# Altium footprint library Connector_Samtec_HLE_SMD.PcbLib: 290 footprints (part 18 of 24) (continued)
## Samtec_HLE-142-02-xxx-DV-LC_2x42_P2.54mm_Horizontal [mm]
pads (86):
  rect 1.27x2.29 smd: 1(-52.07,2.525) 2(-52.07,-2.525) 3(-49.53,2.525) 4(-49.53,-2.525) 5(-46.99,2.525) 6(-46.99,-2.525) 7(-44.45,2.525) 8(-44.45,-2.525) 9(-41.91,2.525) 10(-41.91,-2.525) 11(-39.37,2.525) 12(-39.37,-2.525) 13(-36.83,2.525) 14(-36.83,-2.525) 15(-34.29,2.525) 16(-34.29,-2.525) 17(-31.75,2.525) 18(-31.75,-2.525) 19(-29.21,2.525) 20(-29.21,-2.525) 21(-26.67,2.525) 22(-26.67,-2.525) 23(-24.13,2.525) 24(-24.13,-2.525) 25(-21.59,2.525) 26(-21.59,-2.525) 27(-19.05,2.525) 28(-19.05,-2.525) 29(-16.51,2.525) 30(-16.51,-2.525) 31(-13.97,2.525) 32(-13.97,-2.525) 33(-11.43,2.525) 34(-11.43,-2.525) 35(-8.89,2.525) 36(-8.89,-2.525) 37(-6.35,2.525) 38(-6.35,-2.525) 39(-3.81,2.525) 40(-3.81,-2.525) 41(-1.27,2.525) 42(-1.27,-2.525) 43(1.27,2.525) 44(1.27,-2.525) 45(3.81,2.525) 46(3.81,-2.525) 47(6.35,2.525) 48(6.35,-2.525) 49(8.89,2.525) 50(8.89,-2.525) 51(11.43,2.525) 52(11.43,-2.525) 53(13.97,2.525) 54(13.97,-2.525) 55(16.51,2.525) 56(16.51,-2.525) 57(19.05,2.525) 58(19.05,-2.525) 59(21.59,2.525) 60(21.59,-2.525) 61(24.13,2.525) 62(24.13,-2.525) 63(26.67,2.525) 64(26.67,-2.525) 65(29.21,2.525) 66(29.21,-2.525) 67(31.75,2.525) 68(31.75,-2.525) 69(34.29,2.525) 70(34.29,-2.525) 71(36.83,2.525) 72(36.83,-2.525) 73(39.37,2.525) 74(39.37,-2.525) 75(41.91,2.525) 76(41.91,-2.525) 77(44.45,2.525) 78(44.45,-2.525) 79(46.99,2.525) 80(46.99,-2.525) 81(49.53,2.525) 82(49.53,-2.525) 83(52.07,2.525) 84(52.07,-2.525)
  round 1.19 hole 1.19: Un1(-50.8,0) Un2(50.8,0)
F.SilkS:
  lines w0.12: -52.965,-2.65 -53.45,-2.65 -53.45,2.65 -52.965,2.65 -52.965,3.67 ; -51.175,-2.65 -50.425,-2.65 ; -51.175,2.65 -50.425,2.65 ; -48.635,-2.65 -47.885,-2.65 ; -48.635,2.65 -47.885,2.65 ; -46.095,-2.65 -45.345,-2.65 ; -46.095,2.65 -45.345,2.65 ; -43.555,-2.65 -42.805,-2.65 ; -43.555,2.65 -42.805,2.65 ; -41.015,-2.65 -40.265,-2.65 ; -41.015,2.65 -40.265,2.65 ; -38.475,-2.65 -37.725,-2.65 ; -38.475,2.65 -37.725,2.65 ; -35.935,-2.65 -35.185,-2.65 ; -35.935,2.65 -35.185,2.65 ; -33.395,-2.65 -32.645,-2.65 ; -33.395,2.65 -32.645,2.65 ; -30.855,-2.65 -30.105,-2.65 ; -30.855,2.65 -30.105,2.65 ; -28.315,-2.65 -27.565,-2.65 ; -28.315,2.65 -27.565,2.65 ; -25.775,-2.65 -25.025,-2.65 ; -25.775,2.65 -25.025,2.65 ; -23.235,-2.65 -22.485,-2.65 ; -23.235,2.65 -22.485,2.65 ; -20.695,-2.65 -19.945,-2.65 ; -20.695,2.65 -19.945,2.65 ; -18.155,-2.65 -17.405,-2.65 ; -18.155,2.65 -17.405,2.65 ; -15.615,-2.65 -14.865,-2.65 ; -15.615,2.65 -14.865,2.65 ; -13.075,-2.65 -12.325,-2.65 ; -13.075,2.65 -12.325,2.65 ; -10.535,-2.65 -9.785,-2.65 ; -10.535,2.65 -9.785,2.65 ; -7.995,-2.65 -7.245,-2.65 ; -7.995,2.65 -7.245,2.65 ; -5.455,-2.65 -4.705,-2.65 ; -5.455,2.65 -4.705,2.65 ; -2.915,-2.65 -2.165,-2.65 ; -2.915,2.65 -2.165,2.65 ; -0.375,-2.65 0.375,-2.65 ; -0.375,2.65 0.375,2.65 ; 2.165,-2.65 2.915,-2.65 ; 2.165,2.65 2.915,2.65 ; 4.705,-2.65 5.455,-2.65 ; 4.705,2.65 5.455,2.65 ; 7.245,-2.65 7.995,-2.65 ; 7.245,2.65 7.995,2.65 ; 9.785,-2.65 10.535,-2.65 ; 9.785,2.65 10.535,2.65 ; 12.325,-2.65 13.075,-2.65 ; 12.325,2.65 13.075,2.65 ; 14.865,-2.65 15.615,-2.65 ; 14.865,2.65 15.615,2.65 ; 17.405,-2.65 18.155,-2.65 ; 17.405,2.65 18.155,2.65 ; 19.945,-2.65 20.695,-2.65 ; 19.945,2.65 20.695,2.65 ; 22.485,-2.65 23.235,-2.65 ; 22.485,2.65 23.235,2.65 ; 25.025,-2.65 25.775,-2.65 ; 25.025,2.65 25.775,2.65 ; 27.565,-2.65 28.315,-2.65 ; 27.565,2.65 28.315,2.65 ; 30.105,-2.65 30.855,-2.65 ; 30.105,2.65 30.855,2.65 ; 32.645,-2.65 33.395,-2.65 ; 32.645,2.65 33.395,2.65 ; 35.185,-2.65 35.935,-2.65 ; 35.185,2.65 35.935,2.65 ; 37.725,-2.65 38.475,-2.65 ; 37.725,2.65 38.475,2.65 ; 40.265,-2.65 41.015,-2.65 ; 40.265,2.65 41.015,2.65 ; 42.805,-2.65 43.555,-2.65 ; 42.805,2.65 43.555,2.65 ; 45.345,-2.65 46.095,-2.65 ; 45.345,2.65 46.095,2.65 ; 47.885,-2.65 48.635,-2.65 ; 47.885,2.65 48.635,2.65 ; 50.425,-2.65 51.175,-2.65 ; 50.425,2.65 51.175,2.65 ; 52.965,-2.65 53.45,-2.65 53.45,2.65 52.965,2.65
F.CrtYd:
  lines w0.05: -53.84,-4.17 -53.84,4.17 53.84,4.17 53.84,-4.17 -53.84,-4.17
F.Fab:
  lines w0.1: -52.57,2.54 -52.07,1.833 -51.57,2.54 ; -53.34,-2.54 -53.34,2.54 53.34,2.54 53.34,-2.54 -53.34,-2.54
  text "'.Designator'" at -4.047,-2.68 h1

## Samtec_HLE-142-02-xxx-DV_2x42_P2.54mm_Horizontal [mm]
pads (84):
  rect 1.27x2.29 smd: 1(-52.07,2.525) 2(-52.07,-2.525) 3(-49.53,2.525) 4(-49.53,-2.525) 5(-46.99,2.525) 6(-46.99,-2.525) 7(-44.45,2.525) 8(-44.45,-2.525) 9(-41.91,2.525) 10(-41.91,-2.525) 11(-39.37,2.525) 12(-39.37,-2.525) 13(-36.83,2.525) 14(-36.83,-2.525) 15(-34.29,2.525) 16(-34.29,-2.525) 17(-31.75,2.525) 18(-31.75,-2.525) 19(-29.21,2.525) 20(-29.21,-2.525) 21(-26.67,2.525) 22(-26.67,-2.525) 23(-24.13,2.525) 24(-24.13,-2.525) 25(-21.59,2.525) 26(-21.59,-2.525) 27(-19.05,2.525) 28(-19.05,-2.525) 29(-16.51,2.525) 30(-16.51,-2.525) 31(-13.97,2.525) 32(-13.97,-2.525) 33(-11.43,2.525) 34(-11.43,-2.525) 35(-8.89,2.525) 36(-8.89,-2.525) 37(-6.35,2.525) 38(-6.35,-2.525) 39(-3.81,2.525) 40(-3.81,-2.525) 41(-1.27,2.525) 42(-1.27,-2.525) 43(1.27,2.525) 44(1.27,-2.525) 45(3.81,2.525) 46(3.81,-2.525) 47(6.35,2.525) 48(6.35,-2.525) 49(8.89,2.525) 50(8.89,-2.525) 51(11.43,2.525) 52(11.43,-2.525) 53(13.97,2.525) 54(13.97,-2.525) 55(16.51,2.525) 56(16.51,-2.525) 57(19.05,2.525) 58(19.05,-2.525) 59(21.59,2.525) 60(21.59,-2.525) 61(24.13,2.525) 62(24.13,-2.525) 63(26.67,2.525) 64(26.67,-2.525) 65(29.21,2.525) 66(29.21,-2.525) 67(31.75,2.525) 68(31.75,-2.525) 69(34.29,2.525) 70(34.29,-2.525) 71(36.83,2.525) 72(36.83,-2.525) 73(39.37,2.525) 74(39.37,-2.525) 75(41.91,2.525) 76(41.91,-2.525) 77(44.45,2.525) 78(44.45,-2.525) 79(46.99,2.525) 80(46.99,-2.525) 81(49.53,2.525) 82(49.53,-2.525) 83(52.07,2.525) 84(52.07,-2.525)
F.SilkS:
  lines w0.12: -52.965,-2.65 -53.45,-2.65 -53.45,2.65 -52.965,2.65 -52.965,3.67 ; -51.175,-2.65 -50.425,-2.65 ; -51.175,2.65 -50.425,2.65 ; -48.635,-2.65 -47.885,-2.65 ; -48.635,2.65 -47.885,2.65 ; -46.095,-2.65 -45.345,-2.65 ; -46.095,2.65 -45.345,2.65 ; -43.555,-2.65 -42.805,-2.65 ; -43.555,2.65 -42.805,2.65 ; -41.015,-2.65 -40.265,-2.65 ; -41.015,2.65 -40.265,2.65 ; -38.475,-2.65 -37.725,-2.65 ; -38.475,2.65 -37.725,2.65 ; -35.935,-2.65 -35.185,-2.65 ; -35.935,2.65 -35.185,2.65 ; -33.395,-2.65 -32.645,-2.65 ; -33.395,2.65 -32.645,2.65 ; -30.855,-2.65 -30.105,-2.65 ; -30.855,2.65 -30.105,2.65 ; -28.315,-2.65 -27.565,-2.65 ; -28.315,2.65 -27.565,2.65 ; -25.775,-2.65 -25.025,-2.65 ; -25.775,2.65 -25.025,2.65 ; -23.235,-2.65 -22.485,-2.65 ; -23.235,2.65 -22.485,2.65 ; -20.695,-2.65 -19.945,-2.65 ; -20.695,2.65 -19.945,2.65 ; -18.155,-2.65 -17.405,-2.65 ; -18.155,2.65 -17.405,2.65 ; -15.615,-2.65 -14.865,-2.65 ; -15.615,2.65 -14.865,2.65 ; -13.075,-2.65 -12.325,-2.65 ; -13.075,2.65 -12.325,2.65 ; -10.535,-2.65 -9.785,-2.65 ; -10.535,2.65 -9.785,2.65 ; -7.995,-2.65 -7.245,-2.65 ; -7.995,2.65 -7.245,2.65 ; -5.455,-2.65 -4.705,-2.65 ; -5.455,2.65 -4.705,2.65 ; -2.915,-2.65 -2.165,-2.65 ; -2.915,2.65 -2.165,2.65 ; -0.375,-2.65 0.375,-2.65 ; -0.375,2.65 0.375,2.65 ; 2.165,-2.65 2.915,-2.65 ; 2.165,2.65 2.915,2.65 ; 4.705,-2.65 5.455,-2.65 ; 4.705,2.65 5.455,2.65 ; 7.245,-2.65 7.995,-2.65 ; 7.245,2.65 7.995,2.65 ; 9.785,-2.65 10.535,-2.65 ; 9.785,2.65 10.535,2.65 ; 12.325,-2.65 13.075,-2.65 ; 12.325,2.65 13.075,2.65 ; 14.865,-2.65 15.615,-2.65 ; 14.865,2.65 15.615,2.65 ; 17.405,-2.65 18.155,-2.65 ; 17.405,2.65 18.155,2.65 ; 19.945,-2.65 20.695,-2.65 ; 19.945,2.65 20.695,2.65 ; 22.485,-2.65 23.235,-2.65 ; 22.485,2.65 23.235,2.65 ; 25.025,-2.65 25.775,-2.65 ; 25.025,2.65 25.775,2.65 ; 27.565,-2.65 28.315,-2.65 ; 27.565,2.65 28.315,2.65 ; 30.105,-2.65 30.855,-2.65 ; 30.105,2.65 30.855,2.65 ; 32.645,-2.65 33.395,-2.65 ; 32.645,2.65 33.395,2.65 ; 35.185,-2.65 35.935,-2.65 ; 35.185,2.65 35.935,2.65 ; 37.725,-2.65 38.475,-2.65 ; 37.725,2.65 38.475,2.65 ; 40.265,-2.65 41.015,-2.65 ; 40.265,2.65 41.015,2.65 ; 42.805,-2.65 43.555,-2.65 ; 42.805,2.65 43.555,2.65 ; 45.345,-2.65 46.095,-2.65 ; 45.345,2.65 46.095,2.65 ; 47.885,-2.65 48.635,-2.65 ; 47.885,2.65 48.635,2.65 ; 50.425,-2.65 51.175,-2.65 ; 50.425,2.65 51.175,2.65 ; 52.965,-2.65 53.45,-2.65 53.45,2.65 52.965,2.65
F.CrtYd:
  lines w0.05: -53.84,-4.17 -53.84,4.17 53.84,4.17 53.84,-4.17 -53.84,-4.17
F.Fab:
  lines w0.1: -52.57,2.54 -52.07,1.833 -51.57,2.54 ; -53.34,-2.54 53.34,-2.54 53.34,2.54 -53.34,2.54 -53.34,-2.54
  text "'.Designator'" at -4.047,-2.68 h1

## Samtec_HLE-143-02-xxx-DV-A_2x43_P2.54mm_Horizontal [mm]
pads (88):
  rect 1.27x2.29 smd: 1(-53.34,2.525) 2(-53.34,-2.525) 3(-50.8,2.525) 4(-50.8,-2.525) 5(-48.26,2.525) 6(-48.26,-2.525) 7(-45.72,2.525) 8(-45.72,-2.525) 9(-43.18,2.525) 10(-43.18,-2.525) 11(-40.64,2.525) 12(-40.64,-2.525) 13(-38.1,2.525) 14(-38.1,-2.525) 15(-35.56,2.525) 16(-35.56,-2.525) 17(-33.02,2.525) 18(-33.02,-2.525) 19(-30.48,2.525) 20(-30.48,-2.525) 21(-27.94,2.525) 22(-27.94,-2.525) 23(-25.4,2.525) 24(-25.4,-2.525) 25(-22.86,2.525) 26(-22.86,-2.525) 27(-20.32,2.525) 28(-20.32,-2.525) 29(-17.78,2.525) 30(-17.78,-2.525) 31(-15.24,2.525) 32(-15.24,-2.525) 33(-12.7,2.525) 34(-12.7,-2.525) 35(-10.16,2.525) 36(-10.16,-2.525) 37(-7.62,2.525) 38(-7.62,-2.525) 39(-5.08,2.525) 40(-5.08,-2.525) 41(-2.54,2.525) 42(-2.54,-2.525) 43(0,2.525) 44(0,-2.525) 45(2.54,2.525) 46(2.54,-2.525) 47(5.08,2.525) 48(5.08,-2.525) 49(7.62,2.525) 50(7.62,-2.525) 51(10.16,2.525) 52(10.16,-2.525) 53(12.7,2.525) 54(12.7,-2.525) 55(15.24,2.525) 56(15.24,-2.525) 57(17.78,2.525) 58(17.78,-2.525) 59(20.32,2.525) 60(20.32,-2.525) 61(22.86,2.525) 62(22.86,-2.525) 63(25.4,2.525) 64(25.4,-2.525) 65(27.94,2.525) 66(27.94,-2.525) 67(30.48,2.525) 68(30.48,-2.525) 69(33.02,2.525) 70(33.02,-2.525) 71(35.56,2.525) 72(35.56,-2.525) 73(38.1,2.525) 74(38.1,-2.525) 75(40.64,2.525) 76(40.64,-2.525) 77(43.18,2.525) 78(43.18,-2.525) 79(45.72,2.525) 80(45.72,-2.525) 81(48.26,2.525) 82(48.26,-2.525) 83(50.8,2.525) 84(50.8,-2.525) 85(53.34,2.525) 86(53.34,-2.525)
  round 1.78 hole 1.78: Un1(-52.07,0) Un2(52.07,0)
F.SilkS:
  lines w0.12: -54.235,-2.65 -54.72,-2.65 -54.72,2.65 -54.235,2.65 -54.235,3.67 ; -52.445,-2.65 -51.695,-2.65 ; -52.445,2.65 -51.695,2.65 ; -49.905,-2.65 -49.155,-2.65 ; -49.905,2.65 -49.155,2.65 ; -47.365,-2.65 -46.615,-2.65 ; -47.365,2.65 -46.615,2.65 ; -44.825,-2.65 -44.075,-2.65 ; -44.825,2.65 -44.075,2.65 ; -42.285,-2.65 -41.535,-2.65 ; -42.285,2.65 -41.535,2.65 ; -39.745,-2.65 -38.995,-2.65 ; -39.745,2.65 -38.995,2.65 ; -37.205,-2.65 -36.455,-2.65 ; -37.205,2.65 -36.455,2.65 ; -34.665,-2.65 -33.915,-2.65 ; -34.665,2.65 -33.915,2.65 ; -32.125,-2.65 -31.375,-2.65 ; -32.125,2.65 -31.375,2.65 ; -29.585,-2.65 -28.835,-2.65 ; -29.585,2.65 -28.835,2.65 ; -27.045,-2.65 -26.295,-2.65 ; -27.045,2.65 -26.295,2.65 ; -24.505,-2.65 -23.755,-2.65 ; -24.505,2.65 -23.755,2.65 ; -21.965,-2.65 -21.215,-2.65 ; -21.965,2.65 -21.215,2.65 ; -19.425,-2.65 -18.675,-2.65 ; -19.425,2.65 -18.675,2.65 ; -16.885,-2.65 -16.135,-2.65 ; -16.885,2.65 -16.135,2.65 ; -14.345,-2.65 -13.595,-2.65 ; -14.345,2.65 -13.595,2.65 ; -11.805,-2.65 -11.055,-2.65 ; -11.805,2.65 -11.055,2.65 ; -9.265,-2.65 -8.515,-2.65 ; -9.265,2.65 -8.515,2.65 ; -6.725,-2.65 -5.975,-2.65 ; -6.725,2.65 -5.975,2.65 ; -4.185,-2.65 -3.435,-2.65 ; -4.185,2.65 -3.435,2.65 ; -1.645,-2.65 -0.895,-2.65 ; -1.645,2.65 -0.895,2.65 ; 0.895,-2.65 1.645,-2.65 ; 0.895,2.65 1.645,2.65 ; 3.435,-2.65 4.185,-2.65 ; 3.435,2.65 4.185,2.65 ; 5.975,-2.65 6.725,-2.65 ; 5.975,2.65 6.725,2.65 ; 8.515,-2.65 9.265,-2.65 ; 8.515,2.65 9.265,2.65 ; 11.055,-2.65 11.805,-2.65 ; 11.055,2.65 11.805,2.65 ; 13.595,-2.65 14.345,-2.65 ; 13.595,2.65 14.345,2.65 ; 16.135,-2.65 16.885,-2.65 ; 16.135,2.65 16.885,2.65 ; 18.675,-2.65 19.425,-2.65 ; 18.675,2.65 19.425,2.65 ; 21.215,-2.65 21.965,-2.65 ; 21.215,2.65 21.965,2.65 ; 23.755,-2.65 24.505,-2.65 ; 23.755,2.65 24.505,2.65 ; 26.295,-2.65 27.045,-2.65 ; 26.295,2.65 27.045,2.65 ; 28.835,-2.65 29.585,-2.65 ; 28.835,2.65 29.585,2.65 ; 31.375,-2.65 32.125,-2.65 ; 31.375,2.65 32.125,2.65 ; 33.915,-2.65 34.665,-2.65 ; 33.915,2.65 34.665,2.65 ; 36.455,-2.65 37.205,-2.65 ; 36.455,2.65 37.205,2.65 ; 38.995,-2.65 39.745,-2.65 ; 38.995,2.65 39.745,2.65 ; 41.535,-2.65 42.285,-2.65 ; 41.535,2.65 42.285,2.65 ; 44.075,-2.65 44.825,-2.65 ; 44.075,2.65 44.825,2.65 ; 46.615,-2.65 47.365,-2.65 ; 46.615,2.65 47.365,2.65 ; 49.155,-2.65 49.905,-2.65 ; 49.155,2.65 49.905,2.65 ; 51.695,-2.65 52.445,-2.65 ; 51.695,2.65 52.445,2.65 ; 54.235,-2.65 54.72,-2.65 54.72,2.65 54.235,2.65
F.CrtYd:
  lines w0.05: -55.11,-4.17 -55.11,4.17 55.11,4.17 55.11,-4.17 -55.11,-4.17
F.Fab:
  lines w0.1: -53.84,2.54 -53.34,1.833 -52.84,2.54 ; -54.61,-2.54 -54.61,2.54 54.61,2.54 54.61,-2.54 -54.61,-2.54
  text "'.Designator'" at -4.047,-2.68 h1

## Samtec_HLE-143-02-xxx-DV-BE-A_2x43_P2.54mm_Horizontal [mm]
pads (174):
  rect 1.27x1.68 smd: 1(-53.34,2.72) 2(-53.34,-2.72) 3(-50.8,2.72) 4(-50.8,-2.72) 5(-48.26,2.72) 6(-48.26,-2.72) 7(-45.72,2.72) 8(-45.72,-2.72) 9(-43.18,2.72) 10(-43.18,-2.72) 11(-40.64,2.72) 12(-40.64,-2.72) 13(-38.1,2.72) 14(-38.1,-2.72) 15(-35.56,2.72) 16(-35.56,-2.72) 17(-33.02,2.72) 18(-33.02,-2.72) 19(-30.48,2.72) 20(-30.48,-2.72) 21(-27.94,2.72) 22(-27.94,-2.72) 23(-25.4,2.72) 24(-25.4,-2.72) 25(-22.86,2.72) 26(-22.86,-2.72) 27(-20.32,2.72) 28(-20.32,-2.72) 29(-17.78,2.72) 30(-17.78,-2.72) 31(-15.24,2.72) 32(-15.24,-2.72) 33(-12.7,2.72) 34(-12.7,-2.72) 35(-10.16,2.72) 36(-10.16,-2.72) 37(-7.62,2.72) 38(-7.62,-2.72) 39(-5.08,2.72) 40(-5.08,-2.72) 41(-2.54,2.72) 42(-2.54,-2.72) 43(0,2.72) 44(0,-2.72) 45(2.54,2.72) 46(2.54,-2.72) 47(5.08,2.72) 48(5.08,-2.72) 49(7.62,2.72) 50(7.62,-2.72) 51(10.16,2.72) 52(10.16,-2.72) 53(12.7,2.72) 54(12.7,-2.72) 55(15.24,2.72) 56(15.24,-2.72) 57(17.78,2.72) 58(17.78,-2.72) 59(20.32,2.72) 60(20.32,-2.72) 61(22.86,2.72) 62(22.86,-2.72) 63(25.4,2.72) 64(25.4,-2.72) 65(27.94,2.72) 66(27.94,-2.72) 67(30.48,2.72) 68(30.48,-2.72) 69(33.02,2.72) 70(33.02,-2.72) 71(35.56,2.72) 72(35.56,-2.72) 73(38.1,2.72) 74(38.1,-2.72) 75(40.64,2.72) 76(40.64,-2.72) 77(43.18,2.72) 78(43.18,-2.72) 79(45.72,2.72) 80(45.72,-2.72) 81(48.26,2.72) 82(48.26,-2.72) 83(50.8,2.72) 84(50.8,-2.72) 85(53.34,2.72) 86(53.34,-2.72)
  round 0.97 hole 0.97: Un1(33.02,-1.27) Un2(53.34,1.27) Un3(35.56,-1.27) Un4(-40.64,1.27) Un5(-50.8,-1.27) Un6(-12.7,-1.27) Un7(48.26,-1.27) Un8(12.7,1.27) Un9(15.24,-1.27) Un10(-20.32,-1.27) Un11(-17.78,-1.27) Un12(-48.26,1.27) Un13(-33.02,-1.27) Un14(43.18,1.27) Un15(43.18,-1.27) Un16(35.56,1.27) Un17(-53.34,1.27) Un18(-30.48,-1.27) Un19(7.62,-1.27) Un20(33.02,1.27) Un21(-15.24,1.27) Un22(-53.34,-1.27) Un23(48.26,1.27) Un24(-38.1,-1.27) Un25(-22.86,1.27) Un26(50.8,1.27) Un27(-27.94,1.27) Un28(-5.08,-1.27) Un29(25.4,1.27) Un30(-35.56,1.27) Un31(40.64,-1.27) Un32(38.1,1.27) Un33(10.16,1.27) Un34(-25.4,-1.27) Un35(-22.86,-1.27) Un36(-45.72,1.27) Un37(38.1,-1.27) Un38(-15.24,-1.27) Un39(-40.64,-1.27) Un40(-10.16,-1.27) Un41(50.8,-1.27) Un42(45.72,-1.27) Un43(2.54,1.27) Un44(-12.7,1.27) Un45(-25.4,1.27) Un46(-30.48,1.27) Un47(-38.1,1.27) Un48(30.48,1.27) Un49(5.08,-1.27) Un50(-7.62,-1.27) Un51(0,1.27) Un52(12.7,-1.27) Un53(30.48,-1.27) Un54(15.24,1.27) Un56(27.94,1.27) Un57(-17.78,1.27) Un58(7.62,1.27) Un59(2.54,-1.27) Un60(10.16,-1.27) Un61(-5.08,1.27) Un62(20.32,1.27) Un63(22.86,1.27) Un64(-2.54,1.27) Un65(45.72,1.27) Un66(-48.26,-1.27) Un67(20.32,-1.27) Un68(-45.72,-1.27) Un69(53.34,-1.27) Un70(17.78,1.27) Un71(27.94,-1.27) Un72(40.64,1.27) Un73(-33.02,1.27) Un74(0,-1.27) Un75(-35.56,-1.27) Un76(-50.8,1.27) Un77(-43.18,-1.27) Un78(17.78,-1.27) Un79(-2.54,-1.27) Un80(-27.94,-1.27) Un81(25.4,-1.27) Un82(-10.16,1.27) Un83(-43.18,1.27) Un84(-7.62,1.27) Un85(-20.32,1.27) Un87(22.86,-1.27) Un88(5.08,1.27)
  round 1.78 hole 1.78: Un55(52.07,0) Un86(-52.07,0)
F.SilkS:
  lines w0.12: -54.235,-2.65 -54.72,-2.65 -54.72,2.65 -54.235,2.65 -54.235,3.56 ; -52.445,-2.65 -51.695,-2.65 ; -52.445,2.65 -51.695,2.65 ; -49.905,-2.65 -49.155,-2.65 ; -49.905,2.65 -49.155,2.65 ; -47.365,-2.65 -46.615,-2.65 ; -47.365,2.65 -46.615,2.65 ; -44.825,-2.65 -44.075,-2.65 ; -44.825,2.65 -44.075,2.65 ; -42.285,-2.65 -41.535,-2.65 ; -42.285,2.65 -41.535,2.65 ; -39.745,-2.65 -38.995,-2.65 ; -39.745,2.65 -38.995,2.65 ; -37.205,-2.65 -36.455,-2.65 ; -37.205,2.65 -36.455,2.65 ; -34.665,-2.65 -33.915,-2.65 ; -34.665,2.65 -33.915,2.65 ; -32.125,-2.65 -31.375,-2.65 ; -32.125,2.65 -31.375,2.65 ; -29.585,-2.65 -28.835,-2.65 ; -29.585,2.65 -28.835,2.65 ; -27.045,-2.65 -26.295,-2.65 ; -27.045,2.65 -26.295,2.65 ; -24.505,-2.65 -23.755,-2.65 ; -24.505,2.65 -23.755,2.65 ; -21.965,-2.65 -21.215,-2.65 ; -21.965,2.65 -21.215,2.65 ; -19.425,-2.65 -18.675,-2.65 ; -19.425,2.65 -18.675,2.65 ; -16.885,-2.65 -16.135,-2.65 ; -16.885,2.65 -16.135,2.65 ; -14.345,-2.65 -13.595,-2.65 ; -14.345,2.65 -13.595,2.65 ; -11.805,-2.65 -11.055,-2.65 ; -11.805,2.65 -11.055,2.65 ; -9.265,-2.65 -8.515,-2.65 ; -9.265,2.65 -8.515,2.65 ; -6.725,-2.65 -5.975,-2.65 ; -6.725,2.65 -5.975,2.65 ; -4.185,-2.65 -3.435,-2.65 ; -4.185,2.65 -3.435,2.65 ; -1.645,-2.65 -0.895,-2.65 ; -1.645,2.65 -0.895,2.65 ; 0.895,-2.65 1.645,-2.65 ; 0.895,2.65 1.645,2.65 ; 3.435,-2.65 4.185,-2.65 ; 3.435,2.65 4.185,2.65 ; 5.975,-2.65 6.725,-2.65 ; 5.975,2.65 6.725,2.65 ; 8.515,-2.65 9.265,-2.65 ; 8.515,2.65 9.265,2.65 ; 11.055,-2.65 11.805,-2.65 ; 11.055,2.65 11.805,2.65 ; 13.595,-2.65 14.345,-2.65 ; 13.595,2.65 14.345,2.65 ; 16.135,-2.65 16.885,-2.65 ; 16.135,2.65 16.885,2.65 ; 18.675,-2.65 19.425,-2.65 ; 18.675,2.65 19.425,2.65 ; 21.215,-2.65 21.965,-2.65 ; 21.215,2.65 21.965,2.65 ; 23.755,-2.65 24.505,-2.65 ; 23.755,2.65 24.505,2.65 ; 26.295,-2.65 27.045,-2.65 ; 26.295,2.65 27.045,2.65 ; 28.835,-2.65 29.585,-2.65 ; 28.835,2.65 29.585,2.65 ; 31.375,-2.65 32.125,-2.65 ; 31.375,2.65 32.125,2.65 ; 33.915,-2.65 34.665,-2.65 ; 33.915,2.65 34.665,2.65 ; 36.455,-2.65 37.205,-2.65 ; 36.455,2.65 37.205,2.65 ; 38.995,-2.65 39.745,-2.65 ; 38.995,2.65 39.745,2.65 ; 41.535,-2.65 42.285,-2.65 ; 41.535,2.65 42.285,2.65 ; 44.075,-2.65 44.825,-2.65 ; 44.075,2.65 44.825,2.65 ; 46.615,-2.65 47.365,-2.65 ; 46.615,2.65 47.365,2.65 ; 49.155,-2.65 49.905,-2.65 ; 49.155,2.65 49.905,2.65 ; 51.695,-2.65 52.445,-2.65 ; 51.695,2.65 52.445,2.65 ; 54.235,-2.65 54.72,-2.65 54.72,2.65 54.235,2.65
F.CrtYd:
  lines w0.05: -55.11,-4.06 -55.11,4.06 55.11,4.06 55.11,-4.06 -55.11,-4.06
F.Fab:
  lines w0.1: -53.84,2.54 -53.34,1.833 -52.84,2.54 ; -54.61,-2.54 54.61,-2.54 54.61,2.54 -54.61,2.54 -54.61,-2.54
  text "'.Designator'" at -4.047,-2.68 h1

## Samtec_HLE-143-02-xxx-DV-BE-LC_2x43_P2.54mm_Horizontal [mm]
pads (174):
  rect 1.27x1.68 smd: 1(-53.34,2.72) 2(-53.34,-2.72) 3(-50.8,2.72) 4(-50.8,-2.72) 5(-48.26,2.72) 6(-48.26,-2.72) 7(-45.72,2.72) 8(-45.72,-2.72) 9(-43.18,2.72) 10(-43.18,-2.72) 11(-40.64,2.72) 12(-40.64,-2.72) 13(-38.1,2.72) 14(-38.1,-2.72) 15(-35.56,2.72) 16(-35.56,-2.72) 17(-33.02,2.72) 18(-33.02,-2.72) 19(-30.48,2.72) 20(-30.48,-2.72) 21(-27.94,2.72) 22(-27.94,-2.72) 23(-25.4,2.72) 24(-25.4,-2.72) 25(-22.86,2.72) 26(-22.86,-2.72) 27(-20.32,2.72) 28(-20.32,-2.72) 29(-17.78,2.72) 30(-17.78,-2.72) 31(-15.24,2.72) 32(-15.24,-2.72) 33(-12.7,2.72) 34(-12.7,-2.72) 35(-10.16,2.72) 36(-10.16,-2.72) 37(-7.62,2.72) 38(-7.62,-2.72) 39(-5.08,2.72) 40(-5.08,-2.72) 41(-2.54,2.72) 42(-2.54,-2.72) 43(0,2.72) 44(0,-2.72) 45(2.54,2.72) 46(2.54,-2.72) 47(5.08,2.72) 48(5.08,-2.72) 49(7.62,2.72) 50(7.62,-2.72) 51(10.16,2.72) 52(10.16,-2.72) 53(12.7,2.72) 54(12.7,-2.72) 55(15.24,2.72) 56(15.24,-2.72) 57(17.78,2.72) 58(17.78,-2.72) 59(20.32,2.72) 60(20.32,-2.72) 61(22.86,2.72) 62(22.86,-2.72) 63(25.4,2.72) 64(25.4,-2.72) 65(27.94,2.72) 66(27.94,-2.72) 67(30.48,2.72) 68(30.48,-2.72) 69(33.02,2.72) 70(33.02,-2.72) 71(35.56,2.72) 72(35.56,-2.72) 73(38.1,2.72) 74(38.1,-2.72) 75(40.64,2.72) 76(40.64,-2.72) 77(43.18,2.72) 78(43.18,-2.72) 79(45.72,2.72) 80(45.72,-2.72) 81(48.26,2.72) 82(48.26,-2.72) 83(50.8,2.72) 84(50.8,-2.72) 85(53.34,2.72) 86(53.34,-2.72)
  round 0.97 hole 0.97: Un1(53.34,-1.27) Un2(30.48,1.27) Un3(7.62,-1.27) Un4(43.18,-1.27) Un5(-43.18,-1.27) Un6(-20.32,-1.27) Un7(-17.78,-1.27) Un8(-27.94,-1.27) Un9(-22.86,-1.27) Un10(-20.32,1.27) Un11(27.94,-1.27) Un12(-25.4,-1.27) Un13(0,1.27) Un14(-48.26,1.27) Un15(-12.7,1.27) Un16(40.64,-1.27) Un17(-50.8,1.27) Un19(15.24,-1.27) Un20(17.78,-1.27) Un21(35.56,-1.27) Un22(22.86,-1.27) Un23(-15.24,-1.27) Un24(25.4,1.27) Un25(12.7,1.27) Un26(-40.64,1.27) Un27(-12.7,-1.27) Un28(35.56,1.27) Un29(-22.86,1.27) Un30(-38.1,1.27) Un31(-30.48,1.27) Un32(-43.18,1.27) Un33(-10.16,-1.27) Un34(-48.26,-1.27) Un35(2.54,1.27) Un36(-50.8,-1.27) Un37(-5.08,-1.27) Un38(-2.54,-1.27) Un39(43.18,1.27) Un40(-40.64,-1.27) Un41(15.24,1.27) Un42(-7.62,1.27) Un43(25.4,-1.27) Un44(-33.02,1.27) Un45(45.72,-1.27) Un46(10.16,1.27) Un47(-53.34,-1.27) Un48(12.7,-1.27) Un49(20.32,-1.27) Un50(0,-1.27) Un51(50.8,1.27) Un52(48.26,1.27) Un53(-33.02,-1.27) Un54(-30.48,-1.27) Un55(27.94,1.27) Un56(-2.54,1.27) Un57(-10.16,1.27) Un58(33.02,1.27) Un59(2.54,-1.27) Un60(48.26,-1.27) Un61(-45.72,-1.27) Un62(30.48,-1.27) Un63(-5.08,1.27) Un64(20.32,1.27) Un65(-27.94,1.27) Un66(53.34,1.27) Un67(-35.56,-1.27) Un68(33.02,-1.27) Un69(50.8,-1.27) Un70(10.16,-1.27) Un71(-35.56,1.27) Un72(-53.34,1.27) Un73(17.78,1.27) Un74(45.72,1.27) Un75(7.62,1.27) Un76(40.64,1.27) Un77(38.1,1.27) Un78(38.1,-1.27) Un79(-17.78,1.27) Un80(5.08,-1.27) Un81(-38.1,-1.27) Un82(5.08,1.27) Un83(-7.62,-1.27) Un84(-25.4,1.27) Un85(-15.24,1.27) Un87(-45.72,1.27) Un88(22.86,1.27)
  round 1.19 hole 1.19: Un18(-52.07,0) Un86(52.07,0)
F.SilkS:
  lines w0.12: -54.235,-2.65 -54.72,-2.65 -54.72,2.65 -54.235,2.65 -54.235,3.56 ; -52.445,-2.65 -51.695,-2.65 ; -52.445,2.65 -51.695,2.65 ; -49.905,-2.65 -49.155,-2.65 ; -49.905,2.65 -49.155,2.65 ; -47.365,-2.65 -46.615,-2.65 ; -47.365,2.65 -46.615,2.65 ; -44.825,-2.65 -44.075,-2.65 ; -44.825,2.65 -44.075,2.65 ; -42.285,-2.65 -41.535,-2.65 ; -42.285,2.65 -41.535,2.65 ; -39.745,-2.65 -38.995,-2.65 ; -39.745,2.65 -38.995,2.65 ; -37.205,-2.65 -36.455,-2.65 ; -37.205,2.65 -36.455,2.65 ; -34.665,-2.65 -33.915,-2.65 ; -34.665,2.65 -33.915,2.65 ; -32.125,-2.65 -31.375,-2.65 ; -32.125,2.65 -31.375,2.65 ; -29.585,-2.65 -28.835,-2.65 ; -29.585,2.65 -28.835,2.65 ; -27.045,-2.65 -26.295,-2.65 ; -27.045,2.65 -26.295,2.65 ; -24.505,-2.65 -23.755,-2.65 ; -24.505,2.65 -23.755,2.65 ; -21.965,-2.65 -21.215,-2.65 ; -21.965,2.65 -21.215,2.65 ; -19.425,-2.65 -18.675,-2.65 ; -19.425,2.65 -18.675,2.65 ; -16.885,-2.65 -16.135,-2.65 ; -16.885,2.65 -16.135,2.65 ; -14.345,-2.65 -13.595,-2.65 ; -14.345,2.65 -13.595,2.65 ; -11.805,-2.65 -11.055,-2.65 ; -11.805,2.65 -11.055,2.65 ; -9.265,-2.65 -8.515,-2.65 ; -9.265,2.65 -8.515,2.65 ; -6.725,-2.65 -5.975,-2.65 ; -6.725,2.65 -5.975,2.65 ; -4.185,-2.65 -3.435,-2.65 ; -4.185,2.65 -3.435,2.65 ; -1.645,-2.65 -0.895,-2.65 ; -1.645,2.65 -0.895,2.65 ; 0.895,-2.65 1.645,-2.65 ; 0.895,2.65 1.645,2.65 ; 3.435,-2.65 4.185,-2.65 ; 3.435,2.65 4.185,2.65 ; 5.975,-2.65 6.725,-2.65 ; 5.975,2.65 6.725,2.65 ; 8.515,-2.65 9.265,-2.65 ; 8.515,2.65 9.265,2.65 ; 11.055,-2.65 11.805,-2.65 ; 11.055,2.65 11.805,2.65 ; 13.595,-2.65 14.345,-2.65 ; 13.595,2.65 14.345,2.65 ; 16.135,-2.65 16.885,-2.65 ; 16.135,2.65 16.885,2.65 ; 18.675,-2.65 19.425,-2.65 ; 18.675,2.65 19.425,2.65 ; 21.215,-2.65 21.965,-2.65 ; 21.215,2.65 21.965,2.65 ; 23.755,-2.65 24.505,-2.65 ; 23.755,2.65 24.505,2.65 ; 26.295,-2.65 27.045,-2.65 ; 26.295,2.65 27.045,2.65 ; 28.835,-2.65 29.585,-2.65 ; 28.835,2.65 29.585,2.65 ; 31.375,-2.65 32.125,-2.65 ; 31.375,2.65 32.125,2.65 ; 33.915,-2.65 34.665,-2.65 ; 33.915,2.65 34.665,2.65 ; 36.455,-2.65 37.205,-2.65 ; 36.455,2.65 37.205,2.65 ; 38.995,-2.65 39.745,-2.65 ; 38.995,2.65 39.745,2.65 ; 41.535,-2.65 42.285,-2.65 ; 41.535,2.65 42.285,2.65 ; 44.075,-2.65 44.825,-2.65 ; 44.075,2.65 44.825,2.65 ; 46.615,-2.65 47.365,-2.65 ; 46.615,2.65 47.365,2.65 ; 49.155,-2.65 49.905,-2.65 ; 49.155,2.65 49.905,2.65 ; 51.695,-2.65 52.445,-2.65 ; 51.695,2.65 52.445,2.65 ; 54.235,-2.65 54.72,-2.65 54.72,2.65 54.235,2.65
F.CrtYd:
  lines w0.05: -55.11,-4.06 -55.11,4.06 55.11,4.06 55.11,-4.06 -55.11,-4.06
F.Fab:
  lines w0.1: -53.84,2.54 -53.34,1.833 -52.84,2.54 ; -54.61,-2.54 -54.61,2.54 54.61,2.54 54.61,-2.54 -54.61,-2.54
  text "'.Designator'" at -4.047,-2.68 h1